# Altium footprint library SBCLib.PcbLib: 120 footprints (part 3 of 8) (continued)
## FCBGA (ABZ) [mm] (continued)
Top Overlay:
  lines w0.5: -12.2,11.2 -12.2,12.2 -11.2,12.2 ; -11.8,-11.8 -11.8,11.2 -11.8,11.8 8.4,11.8 11.8,11.8 11.8,11.6 11.8,-11.8 -10.6,-11.8 -11.8,-11.8
Mechanical 3:
  circle w0.076: c-10.8,10.8 r0.566
  lines w0.076: -11.5,0 11.5,0 ; 0,-11.5 0,11.5 ; -11.9,11.5 -11.9,11.5 ; -11.5,-11.5 -11.5,11.5 11.5,11.5 11.5,-11.5 -11.5,-11.5
  text "28" at 11,12.2 h0.4
  text "27" at 10.2,12.2 h0.4
  text "26" at 9.4,12.2 h0.4
  text "25" at 8.6,12.2 h0.4
  text "24" at 7.8,12.2 h0.4
  text "23" at 7,12.2 h0.4
  text "22" at 6.2,12.2 h0.4
  text "21" at 5.4,12.2 h0.4
  text "20" at 4.6,12.2 h0.4
  text "19" at 3.8,12.2 h0.4
  text "18" at 3,12.2 h0.4
  text "17" at 2.2,12.2 h0.4
  text "16" at 1.4,12.2 h0.4
  text "15" at 0.6,12.2 h0.4
  text "14" at -0.2,12.2 h0.4
  text "13" at -1,12.2 h0.4
  text "12" at -1.8,12.2 h0.4
  text "11" at -2.6,12.2 h0.4
  text "10" at -3.4,12.2 h0.4
  text "9" at -4.2,12.2 h0.4
  text "8" at -5,12.2 h0.4
  text "7" at -5.8,12.2 h0.4
  text "6" at -6.6,12.2 h0.4
  text "5" at -7.4,12.2 h0.4
  text "4" at -8.2,12.2 h0.4
  text "3" at -9,12.2 h0.4
  text "2" at -9.8,12.2 h0.4
  text "1" at -10.6,12.2 h0.4
  text "AH" at -12.8,-11 h0.4
  text "AG" at -12.8,-10.2 h0.4
  text "AF" at -12.8,-9.4 h0.4
  text "AE" at -12.8,-8.6 h0.4
  text "AD" at -12.8,-7.8 h0.4
  text "AC" at -12.8,-7 h0.4
  text "AB" at -12.8,-6.2 h0.4
  text "AA" at -12.8,-5.4 h0.4
  text "Y" at -12.8,-4.6 h0.4
  text "W" at -12.8,-3.8 h0.4
  text "V" at -12.8,-3 h0.4
  text "U" at -12.8,-2.2 h0.4
  text "T" at -12.8,-1.4 h0.4
  text "R" at -12.8,-0.6 h0.4
  text "P" at -12.8,0.2 h0.4
  text "N" at -12.8,1 h0.4
  text "M" at -12.8,1.8 h0.4
  text "L" at -12.8,2.6 h0.4
  text "K" at -12.8,3.4 h0.4
  text "J" at -12.8,4.2 h0.4
  text "H" at -12.8,5 h0.4
  text "G" at -12.8,5.8 h0.4
  text "F" at -12.8,6.6 h0.4
  text "E" at -12.8,7.4 h0.4
  text "D" at -12.8,8.2 h0.4
  text "C" at -12.8,9 h0.4
  text "B" at -12.8,9.8 h0.4
  text "A" at -12.8,10.6 h0.4
Mechanical 10:
  drawing of 181 lines, arcs and shapes, not listed
  text "Power Pins" at -10.8,13.2 h1
Mechanical 12:
  circle w0.3: c-0.4,-6.8 r0.15
  circle w0.3: c0.4,-9.2 r0.15
  circle w0.3: c-0.4,-2 r0.15
  circle w0.3: c-3.6,-7.6 r0.15
  circle w0.3: c-2.8,-6 r0.15
  circle w0.3: c-2.8,-5.2 r0.15
  circle w0.3: c-3.6,-8.4 r0.15
  circle w0.3: c-1.2,-8.4 r0.15
  circle w0.3: c-1.2,-7.6 r0.15
  circle w0.3: c3.6,-8.4 r0.15
  circle w0.3: c3.6,-7.6 r0.15
  circle w0.3: c10.8,-3.6 r0.15
  circle w0.3: c8.4,-3.6 r0.15
  circle w0.3: c7.6,-3.6 r0.15
  circle w0.3: c0.4,-3.6 r0.15
  circle w0.3: c-10.8,-3.6 r0.15
  circle w0.3: c2,-2.8 r0.15
  circle w0.3: c0.4,-2.8 r0.15
  circle w0.3: c5.2,-2 r0.15
  circle w0.3: c4.4,-2 r0.15
  circle w0.3: c2,-2 r0.15
  circle w0.3: c0.4,-2 r0.15
  circle w0.3: c5.2,-1.2 r0.15
  circle w0.3: c2.8,-1.2 r0.15
  circle w0.3: c2,-1.2 r0.15
  circle w0.3: c0.4,-1.2 r0.15
  circle w0.3: c-0.4,-1.2 r0.15
  circle w0.3: c-2,-1.2 r0.15
  circle w0.3: c-2.8,-1.2 r0.15
  circle w0.3: c-3.6,-1.2 r0.15
  circle w0.3: c5.2,-0.4 r0.15
  circle w0.3: c0.4,-0.4 r0.15
  circle w0.3: c-1.2,-0.4 r0.15
  circle w0.3: c-2,-0.4 r0.15
  circle w0.3: c-10.8,-0.4 r0.15
  circle w0.3: c10.8,0.4 r0.15
  circle w0.3: c8.4,1.2 r0.15
  circle w0.3: c7.6,1.2 r0.15
  circle w0.3: c3.6,1.2 r0.15
  circle w0.3: c0.4,1.2 r0.15
  circle w0.3: c-0.4,1.2 r0.15
  circle w0.3: c3.6,2 r0.15
  circle w0.3: c-0.4,2.8 r0.15
  circle w0.3: c-1.2,2.8 r0.15
  circle w0.3: c-7.6,3.6 r0.15
  circle w0.3: c-8.4,3.6 r0.15
  circle w0.3: c8.4,3.6 r0.15
  circle w0.3: c7.6,3.6 r0.15
  circle w0.3: c0.4,3.6 r0.15
  circle w0.3: c-10.8,3.6 r0.15
  circle w0.3: c10.8,4.4 r0.15
  circle w0.3: c0.4,4.4 r0.15
  circle w0.3: c-2,4.4 r0.15
  circle w0.3: c-2,5.2 r0.15
  circle w0.3: c-4.4,6 r0.15
  circle w0.3: c-5.2,6 r0.15
  circle w0.3: c-6,6 r0.15
  circle w0.3: c-6,6.8 r0.15
  circle w0.3: c-10.8,6.8 r0.15
  circle w0.3: c3.6,7.6 r0.15
  circle w0.3: c-1.2,7.6 r0.15
  circle w0.3: c3.6,8.4 r0.15
  circle w0.3: c-1.2,8.4 r0.15
  circle w0.3: c-10.8,10 r0.15
  circle w0.3: c-5.2,-10.8 r0.15
  circle w0.3: c10.8,-10.8 r0.15
  circle w0.3: c4.4,-10.8 r0.15
  circle w0.3: c-10,-10.8 r0.15
  circle w0.3: c-10.8,-10.8 r0.15
  circle w0.3: c-10.8,-10 r0.15
  circle w0.3: c7.6,-7.6 r0.15
  circle w0.3: c-10.8,-7.6 r0.15
  circle w0.3: c4.4,-6 r0.15
  circle w0.3: c-0.4,-6 r0.15
  circle w0.3: c-4.4,-5.2 r0.15
  circle w0.3: c-5.2,-5.2 r0.15
  circle w0.3: c4.4,-5.2 r0.15
  circle w0.3: c0.4,-5.2 r0.15
  circle w0.3: c-0.4,-5.2 r0.15
  circle w0.3: c-3.6,-5.2 r0.15
  circle w0.3: c-6.8,10.8 r0.15
  circle w0.3: c10.8,10.8 r0.15
  circle w0.3: c6.8,10.8 r0.15
  circle w0.3: c-0.4,10.8 r0.15
  circle w0.3: c-10,10.8 r0.15
  circle w0.3: c-10.8,10.8 r0.15
  text "GND Pins" at -10.8,13.2 h1
Mechanical 13:
  circle w0.3: c-4.4,4.4 r0.15
  circle w0.3: c-3.6,4.4 r0.15
  circle w0.3: c1.2,4.4 r0.15
  circle w0.3: c3.6,4.4 r0.15
  circle w0.3: c-4.4,3.6 r0.15
  circle w0.3: c1.2,3.6 r0.15
  circle w0.3: c3.6,3.6 r0.15
  circle w0.3: c-4.4,2.8 r0.15
  circle w0.3: c3.6,0.4 r0.15
  circle w0.3: c4.4,-0.4 r0.15
  circle w0.3: c4.4,-1.2 r0.15
  circle w0.3: c-1.2,-4.4 r0.15
  circle w0.3: c-0.4,-4.4 r0.15
  circle w0.3: c0.4,-4.4 r0.15
  circle w0.3: c1.2,-4.4 r0.15
  text "CAP Pins" at -10.8,13.2 h1
Mechanical 14:
  circle w0.1: c-9.2,2 r0.25
  circle w0.1: c-7.6,2 r0.25
  circle w0.1: c-10.8,-1.2 r0.25
  circle w0.1: c-10.8,6 r0.25
  circle w0.1: c-8.4,-9.2 r0.25
  circle w0.1: c-7.6,6.8 r0.25
  circle w0.1: c-9.2,-9.2 r0.25
  circle w0.1: c-6.8,7.6 r0.25
  circle w0.1: c-6.8,-9.2 r0.25
  circle w0.1: c-9.2,8.4 r0.25
  circle w0.1: c-10,-9.2 r0.25
  circle w0.1: c-6.8,6.8 r0.25
  circle w0.1: c-7.6,-10 r0.25
  circle w0.1: c-6.8,5.2 r0.25
  circle w0.1: c-6.8,1.2 r0.25
  circle w0.1: c-7.6,5.2 r0.25
  circle w0.1: c-6,0.4 r0.25
  circle w0.1: c-8.4,5.2 r0.25
  circle w0.1: c-6.8,4.4 r0.25
  circle w0.1: c-6,5.2 r0.25
  circle w0.1: c-8.4,4.4 r0.25
  circle w0.1: c-10,-0.4 r0.25
  circle w0.1: c-10.8,7.6 r0.25
  circle w0.1: c-6,4.4 r0.25
  circle w0.1: c-9.2,0.4 r0.25
  circle w0.1: c-6.8,3.6 r0.25
  circle w0.1: c-10.8,-2 r0.25
  circle w0.1: c-10,1.2 r0.25
  circle w0.1: c-7.6,4.4 r0.25
  circle w0.1: c-10,-2 r0.25
  circle w0.1: c-6,2 r0.25
  circle w0.1: c-10,-1.2 r0.25
  circle w0.1: c-10,0.4 r0.25
  circle w0.1: c-6,3.6 r0.25
  circle w0.1: c-9.2,-0.4 r0.25
  circle w0.3: c-4.4,0.4 r0.15
  circle w0.3: c-4.4,1.2 r0.15
  circle w0.3: c-8.4,-0.4 r0.15
  circle w0.3: c-6,1.2 r0.15
  circle w0.3: c-7.6,0.4 r0.15
  circle w0.3: c-7.6,-0.4 r0.15
  circle w0.3: c-4.4,-0.4 r0.15
  circle w0.3: c-6.8,0.4 r0.15
  circle w0.1: c-8.4,2 r0.25
  circle w0.1: c-6,-1.2 r0.25
  circle w0.1: c-10.8,1.2 r0.25
  circle w0.1: c-6.8,-1.2 r0.25
  circle w0.1: c-10.8,0.4 r0.25
  circle w0.1: c-4.4,-1.2 r0.25
  circle w0.1: c-8.4,0.4 r0.25
  circle w0.1: c-6.8,-0.4 r0.25
  circle w0.3: c-9.2,5.2 r0.15
  circle w0.3: c-10,5.2 r0.15
  circle w0.3: c-9.2,4.4 r0.15
  circle w0.3: c-10.8,5.2 r0.15
  circle w0.3: c-10,4.4 r0.15
  circle w0.3: c-10.8,4.4 r0.15
  circle w0.3: c-10,3.6 r0.15
  circle w0.3: c-10.8,2.8 r0.15
  circle w0.3: c-10,2.8 r0.15
  circle w0.3: c-9.2,2.8 r0.15
  circle w0.3: c-8.4,2.8 r0.15
  circle w0.3: c-6.8,2.8 r0.15
  circle w0.3: c-10.8,2 r0.15
  circle w0.3: c-7.6,2.8 r0.15
  circle w0.3: c-10,2 r0.15
  circle w0.3: c-6.8,2 r0.15
  text "GPMC Pins" at -10.8,13.2 h1
Mechanical 15:
  circle w0.3: c2.8,-4.4 r0.15
  circle w0.3: c10.8,-2.8 r0.15
  circle w0.3: c10,-4.4 r0.15
  circle w0.3: c10.8,-4.4 r0.15
  circle w0.3: c10.8,-7.6 r0.15
  circle w0.3: c10,-7.6 r0.15
  circle w0.3: c10,-8.4 r0.15
  circle w0.3: c8.4,-10 r0.15
  circle w0.3: c8.4,-10.8 r0.15
  circle w0.3: c9.2,-2.8 r0.15
  circle w0.3: c10,-5.2 r0.15
  circle w0.3: c9.2,-6.8 r0.15
  circle w0.3: c6.8,-6 r0.15
  circle w0.3: c6.8,-7.6 r0.15
  circle w0.3: c9.2,-4.4 r0.15
  circle w0.3: c8.4,-2.8 r0.15
  circle w0.3: c7.6,-2.8 r0.15
  circle w0.3: c8.4,-4.4 r0.15
  circle w0.3: c6.8,-3.6 r0.15
  circle w0.3: c3.6,-3.6 r0.15
  circle w0.3: c6.8,-2.8 r0.15
  circle w0.3: c6,-3.6 r0.15
  circle w0.3: c10.8,-5.2 r0.15
  circle w0.3: c8.4,-5.2 r0.15
  circle w0.3: c9.2,-5.2 r0.15
  circle w0.3: c7.6,-4.4 r0.15
  circle w0.3: c7.6,-5.2 r0.15
  circle w0.3: c6.8,-4.4 r0.15
  circle w0.3: c6,-4.4 r0.15
  circle w0.3: c6.8,-5.2 r0.15
  circle w0.3: c4.4,-4.4 r0.15
  circle w0.3: c10,-6 r0.15
  circle w0.3: c3.6,-4.4 r0.15
  circle w0.3: c10,-6.8 r0.15
  circle w0.3: c10.8,-6.8 r0.15
  circle w0.3: c10.8,-6 r0.15
  circle w0.3: c4.4,-3.6 r0.15
  circle w0.3: c4.4,-2.8 r0.15
  circle w0.3: c8.4,-7.6 r0.15
  circle w0.3: c7.6,-6.8 r0.15
  circle w0.3: c8.4,-6.8 r0.15
  circle w0.3: c9.2,-8.4 r0.15
  circle w0.3: c10.8,-8.4 r0.15
  circle w0.3: c10.8,-9.2 r0.15
  circle w0.3: c10,-10 r0.15
  circle w0.3: c10,-9.2 r0.15
  circle w0.3: c6.8,-6.8 r0.15
  circle w0.3: c6.8,-8.4 r0.15
  circle w0.3: c6.8,-9.2 r0.15
  circle w0.3: c7.6,-8.4 r0.15
  circle w0.3: c7.6,-9.2 r0.15
  circle w0.3: c9.2,-10.8 r0.15
  circle w0.3: c9.2,-10 r0.15
  circle w0.3: c9.2,-9.2 r0.15
  circle w0.3: c8.4,-9.2 r0.15
  circle w0.3: c2.8,-7.6 r0.15
  circle w0.3: c2,-8.4 r0.15
  circle w0.3: c2.8,-9.2 r0.15
  circle w0.3: c5.2,-6.8 r0.15
  circle w0.3: c6,-7.6 r0.15
  circle w0.3: c5.2,-7.6 r0.15
  circle w0.3: c6,-8.4 r0.15
  circle w0.3: c6,-9.2 r0.15
  circle w0.3: c5.2,-8.4 r0.15
  circle w0.3: c6.8,-10 r0.15
  circle w0.3: c6,-10.8 r0.15
  circle w0.3: c5.2,-9.2 r0.15
  circle w0.3: c3.6,-6 r0.15
  circle w0.3: c4.4,-6.8 r0.15
  circle w0.3: c3.6,-6.8 r0.15
  circle w0.3: c4.4,-7.6 r0.15
  circle w0.3: c2.8,-6 r0.15
  circle w0.3: c2.8,-8.4 r0.15
  circle w0.3: c2,-9.2 r0.15
  circle w0.3: c5.2,-10 r0.15
  circle w0.3: c5.2,-10.8 r0.15
  circle w0.3: c4.4,-9.2 r0.15
  circle w0.3: c2.8,-6.8 r0.15
  circle w0.3: c4.4,-8.4 r0.15
  circle w0.3: c7.6,-10.8 r0.15
  circle w0.3: c7.6,-10 r0.15
  circle w0.3: c6,-10 r0.15
  circle w0.3: c6.8,-10.8 r0.15
  text "EMIF CH1 Pins (DDR RAM)" at -10.8,13.2 h1
Mechanical 16:
  circle w0.3: c6,1.2 r0.15
  circle w0.3: c10,2 r0.15
  circle w0.3: c10.8,2 r0.15
  circle w0.3: c10.8,3.6 r0.15
  circle w0.3: c10,3.6 r0.15
  circle w0.3: c10.8,5.2 r0.15
  circle w0.3: c10,5.2 r0.15
  circle w0.3: c10,6 r0.15
  circle w0.3: c10.8,6 r0.15
  circle w0.3: c6,2 r0.15
  circle w0.3: c6.8,3.6 r0.15
  circle w0.3: c7.6,6 r0.15
  circle w0.3: c10.8,6.8 r0.15
  circle w0.3: c9.2,2 r0.15
  circle w0.3: c8.4,2 r0.15
  circle w0.3: c7.6,2 r0.15
  circle w0.3: c6.8,2 r0.15
  circle w0.3: c10.8,2.8 r0.15
  circle w0.3: c8.4,2.8 r0.15
  circle w0.3: c9.2,2.8 r0.15
  circle w0.3: c10,2.8 r0.15
  circle w0.3: c4.4,4.4 r0.15
  circle w0.3: c6,3.6 r0.15
  circle w0.3: c6.8,4.4 r0.15
  circle w0.3: c7.6,2.8 r0.15
  circle w0.3: c6.8,2.8 r0.15
  circle w0.3: c5.2,3.6 r0.15
  circle w0.3: c4.4,3.6 r0.15
  circle w0.3: c6,2.8 r0.15
  circle w0.3: c7.6,4.4 r0.15
  circle w0.3: c9.2,4.4 r0.15
  circle w0.3: c8.4,4.4 r0.15
  circle w0.3: c9.2,6 r0.15
  circle w0.3: c9.2,5.2 r0.15
  circle w0.3: c7.6,5.2 r0.15
  circle w0.3: c8.4,5.2 r0.15
  circle w0.3: c6.8,5.2 r0.15
  circle w0.3: c10.8,7.6 r0.15
  circle w0.3: c10,7.6 r0.15
  circle w0.3: c10,6.8 r0.15
  circle w0.3: c9.2,6.8 r0.15
  circle w0.3: c7.6,6.8 r0.15
  circle w0.3: c8.4,6.8 r0.15
  circle w0.3: c8.4,6 r0.15
  circle w0.3: c9.2,7.6 r0.15
  circle w0.3: c6,-2 r0.15
  circle w0.3: c6,-0.4 r0.15
  circle w0.3: c6,-1.2 r0.15
  circle w0.3: c10.8,1.2 r0.15
  circle w0.3: c9.2,0.4 r0.15
  circle w0.3: c6.8,1.2 r0.15
  circle w0.3: c10,1.2 r0.15
  circle w0.3: c4.4,1.2 r0.15
  circle w0.3: c8.4,0.4 r0.15
  circle w0.3: c6,0.4 r0.15
  circle w0.3: c6.8,0.4 r0.15
  circle w0.3: c10,0.4 r0.15
  circle w0.3: c10,-0.4 r0.15
  circle w0.3: c10.8,-0.4 r0.15
  circle w0.3: c9.2,-0.4 r0.15
  circle w0.3: c8.4,-0.4 r0.15
  circle w0.3: c9.2,-2 r0.15
  circle w0.3: c10,-2 r0.15
  circle w0.3: c6.8,-2 r0.15
  circle w0.3: c7.6,-0.4 r0.15
  circle w0.3: c8.4,-2 r0.15
  circle w0.3: c6.8,-1.2 r0.15
  circle w0.3: c10.8,-2 r0.15
  circle w0.3: c6.8,-0.4 r0.15
  circle w0.3: c10,-1.2 r0.15
  circle w0.3: c10.8,-1.2 r0.15
  circle w0.3: c7.6,-2 r0.15
  circle w0.3: c7.6,0.4 r0.15
  text "EMIF CH2 Pins (DDR RAM)" at -10.8,13.2 h1
Mechanical 17:
  circle w0.3: c2.8,-10.8 r0.15
  circle w0.3: c2,-10.8 r0.15
  circle w0.3: c2,-10 r0.15
  circle w0.3: c2.8,-10 r0.15
  circle w0.3: c3.6,-10.8 r0.15
  circle w0.3: c3.6,-10 r0.15
  circle w0.3: c1.2,-10.8 r0.15
  circle w0.3: c1.2,-10 r0.15
  circle w0.3: c2,6.8 r0.15
  circle w0.3: c8.4,9.2 r0.15
  circle w0.1: c5.2,10 r0.25
  circle w0.1: c4.4,6 r0.25
  circle w0.1: c3.6,6 r0.25
  circle w0.1: c4.4,10 r0.25
  text "HDMI Pins" at -10.8,13.2 h1
Mechanical 18:
  circle w0.3: c-3.6,10.8 r0.15
  circle w0.3: c-4.4,10 r0.15
  circle w0.3: c-4.4,10.8 r0.15
  circle w0.3: c-4.4,9.2 r0.15
  circle w0.3: c-5.2,10.8 r0.15
  circle w0.3: c-6,10.8 r0.15
  circle w0.3: c-5.2,10 r0.15
  circle w0.3: c-6,10 r0.15
  circle w0.3: c-6,9.2 r0.15
  circle w0.3: c-5.2,9.2 r0.15
  circle w0.3: c-6.8,9.2 r0.15
  circle w0.3: c-7.6,10.8 r0.15
  circle w0.3: c-5.2,8.4 r0.15
  circle w0.3: c-6,8.4 r0.15
  circle w0.3: c-4.4,8.4 r0.15
  circle w0.3: c-5.2,7.6 r0.15
  circle w0.3: c-6,7.6 r0.15
  circle w0.3: c-5.2,6.8 r0.15
  circle w0.3: c-4.4,6.8 r0.15
  circle w0.3: c-4.4,7.6 r0.15
  circle w0.3: c-2.8,6 r0.15
  circle w0.3: c-3.6,6.8 r0.15
  circle w0.3: c-3.6,6 r0.15
  circle w0.3: c-2.8,6.8 r0.15
  circle w0.3: c-2.8,7.6 r0.15
  circle w0.3: c-2.8,9.2 r0.15
  circle w0.3: c-2.8,10 r0.15
  circle w0.3: c-3.6,10 r0.15
  circle w0.3: c-2.8,8.4 r0.15
  text "DPI Video Out 1 Pins" at -10.8,13.2 h1
Mechanical 19:
  circle w0.1: c-10,6.8 r0.25
  circle w0.1: c-8.4,-5.2 r0.25
  circle w0.1: c-9.2,-6 r0.25
  circle w0.1: c-9.2,6.8 r0.25
  circle w0.1: c-10.8,8.4 r0.25
  circle w0.1: c-4.4,-6 r0.25
  circle w0.1: c-9.2,-5.2 r0.25
  circle w0.1: c-10,7.6 r0.25
  circle w0.1: c2,8.4 r0.25
  circle w0.1: c-10,8.4 r0.25
  circle w0.1: c1.2,6 r0.25
  circle w0.1: c-8.4,6.8 r0.25
  circle w0.1: c5.2,10.8 r0.25
  circle w0.1: c-10.8,9.2 r0.25
  circle w0.1: c2.8,9.2 r0.25
  circle w0.1: c-8.4,7.6 r0.25
  circle w0.1: c-7.6,6.8 r0.25
  circle w0.1: c2,10.8 r0.25
  circle w0.1: c2,10 r0.25
  circle w0.1: c-6.8,7.6 r0.25
  circle w0.1: c-9.2,8.4 r0.25
  circle w0.1: c1.2,10 r0.25
  circle w0.1: c0.4,8.4 r0.25
  circle w0.1: c-6.8,6.8 r0.25
  circle w0.1: c0.4,10.8 r0.25
  circle w0.1: c-7.6,8.4 r0.25
  circle w0.1: c-10,9.2 r0.25
  circle w0.1: c0.4,10 r0.25
  circle w0.1: c4.4,10.8 r0.25
  circle w0.1: c-9.2,9.2 r0.25
  circle w0.1: c0.4,7.6 r0.25
  circle w0.1: c-8.4,9.2 r0.25
  circle w0.1: c-2,8.4 r0.25
  circle w0.1: c-10,10 r0.25
  circle w0.1: c-2,9.2 r0.25
  circle w0.1: c-6.8,8.4 r0.25
  circle w0.1: c-7.6,9.2 r0.25
  circle w0.1: c-1.2,6.8 r0.25
  circle w0.1: c-2,7.6 r0.25
  circle w0.1: c-9.2,10.8 r0.25
  circle w0.1: c-2.8,4.4 r0.25
  circle w0.1: c-9.2,10 r0.25
  circle w0.1: c-8.4,10 r0.25
  circle w0.1: c-1.2,6 r0.25
  circle w0.1: c-0.4,4.4 r0.25
  circle w0.1: c-7.6,10 r0.25
  circle w0.1: c-8.4,10.8 r0.25
  circle w0.1: c-0.4,10 r0.25
  circle w0.1: c4.4,6.8 r0.25
  circle w0.1: c-6.8,6 r0.25
  circle w0.1: c-10.8,6 r0.25
  circle w0.1: c5.2,7.6 r0.25
  circle w0.1: c5.2,6.8 r0.25
  circle w0.1: c-10.8,7.6 r0.25
  circle w0.1: c-10,6 r0.25
  circle w0.1: c6.8,9.2 r0.25
  circle w0.1: c9.2,10 r0.25
  circle w0.1: c-6,5.2 r0.25
  text "DPI Video Out 2 Pins" at -10.8,13.2 h1
Mechanical 20:
  circle w0.1: c-7.6,0.4 r0.25
  circle w0.1: c-5.2,-8.4 r0.25
  circle w0.1: c-5.2,-7.6 r0.25
  circle w0.1: c-7.6,-0.4 r0.25
  circle w0.1: c-6,-10 r0.25
  circle w0.1: c-4.4,-0.4 r0.25
  circle w0.1: c-6.8,-10.8 r0.25
  circle w0.1: c-6.8,0.4 r0.25
  circle w0.1: c-6,-1.2 r0.25
  circle w0.1: c-9.2,-10.8 r0.25
  circle w0.1: c-7.6,-10.8 r0.25
  circle w0.1: c-6.8,-1.2 r0.25
  circle w0.1: c-6.8,-10 r0.25
  circle w0.1: c-4.4,-7.6 r0.25
  circle w0.1: c-4.4,-1.2 r0.25
  circle w0.1: c-8.4,-10.8 r0.25
  circle w0.1: c-5.2,-10 r0.25
  circle w0.1: c-6.8,-0.4 r0.25
  circle w0.1: c-8.4,-10 r0.25
  circle w0.1: c-9.2,5.2 r0.25
  circle w0.1: c-10,5.2 r0.25
  circle w0.1: c-10,-10 r0.25
  circle w0.1: c-9.2,-10 r0.25
  circle w0.1: c-9.2,4.4 r0.25
  circle w0.1: c-10.8,5.2 r0.25
  circle w0.1: c-7.6,-10 r0.25
  circle w0.1: c-10,-9.2 r0.25
  circle w0.1: c-10,4.4 r0.25
  circle w0.1: c-10.8,4.4 r0.25
  circle w0.1: c-6.8,-9.2 r0.25
  circle w0.1: c-9.2,-9.2 r0.25
  circle w0.1: c-10,3.6 r0.25
  circle w0.1: c-10.8,2.8 r0.25
  circle w0.1: c-8.4,-9.2 r0.25
  circle w0.1: c-10.8,-9.2 r0.25
  circle w0.1: c-5.2,-8.4 r0.25
  circle w0.1: c-10,2.8 r0.25
  circle w0.1: c-9.2,2.8 r0.25
  circle w0.1: c-5.2,-7.6 r0.25
  circle w0.1: c-9.2,-8.4 r0.25
  circle w0.1: c-7.6,-8.4 r0.25
  circle w0.1: c-6,-10 r0.25
  circle w0.1: c-8.4,2.8 r0.25
  circle w0.1: c-10.8,-8.4 r0.25
  circle w0.1: c-6.8,-10.8 r0.25
  circle w0.1: c-6.8,2.8 r0.25
  circle w0.1: c-10.8,2 r0.25
  circle w0.1: c-9.2,-10.8 r0.25
  circle w0.1: c-10,-8.4 r0.25
  circle w0.1: c-6.8,-8.4 r0.25
  circle w0.1: c-7.6,-10.8 r0.25
  circle w0.1: c-7.6,2.8 r0.25
  circle w0.1: c-10,2 r0.25
  circle w0.1: c-6.8,-10 r0.25
  circle w0.1: c-10,-7.6 r0.25
  circle w0.1: c-9.2,-7.6 r0.25
  circle w0.1: c-8.4,-10.8 r0.25
  circle w0.1: c-6.8,2 r0.25
  circle w0.1: c-5.2,-9.2 r0.25
  circle w0.1: c-8.4,-0.4 r0.25
  circle w0.1: c-6,1.2 r0.25
  circle w0.1: c-4.4,-8.4 r0.25
  circle w0.1: c-5.2,-10 r0.25
  circle w0.1: c-4.4,0.4 r0.25
  circle w0.1: c-4.4,-7.6 r0.25
  circle w0.1: c-4.4,1.2 r0.25
  circle w0.1: c-4.4,-9.2 r0.25
  circle w0.1: c-10.8,0.4 r0.25
  text "DPI Video Out 3 Pins" at -10.8,13.2 h1
Mechanical 21:
  circle w0.3: c-2,-7.6 r0.15
  circle w0.3: c-2,-6.8 r0.15
  circle w0.3: c-3.6,-6 r0.15
  circle w0.3: c-2,-9.2 r0.15
  circle w0.3: c-2,-8.4 r0.15
  circle w0.3: c-2.8,-6.8 r0.15
  circle w0.3: c-2.8,-7.6 r0.15
  circle w0.3: c-2.8,-8.4 r0.15
  circle w0.3: c-2.8,-9.2 r0.15
  circle w0.3: c-3.6,-6.8 r0.15
  text "USB Pins" at -10.8,13.2 h1
Mechanical 22:
  circle w0.3: c-4.4,-10.8 r0.15
  circle w0.3: c-4.4,-10 r0.15
  circle w0.3: c-3.6,-10 r0.15
  circle w0.3: c-3.6,-10.8 r0.15
  circle w0.1: c6,10.8 r0.25
  circle w0.1: c3.6,6 r0.25
  text "SATA Pins" at -10.8,13.2 h1
Mechanical 23:
  circle w0.3: c-1.2,-10 r0.15
  circle w0.3: c-1.2,-10.8 r0.15
  circle w0.3: c-0.4,-10 r0.15
  circle w0.3: c-0.4,-10.8 r0.15
  circle w0.3: c-2.8,-10 r0.15
  circle w0.3: c-2.8,-10.8 r0.15
  circle w0.3: c-2,-10 r0.15
  circle w0.3: c-2,-10.8 r0.15
  circle w0.3: c0.4,-10 r0.15
  circle w0.3: c0.4,-10.8 r0.15
  text "PCIe Pins" at -10.8,13.2 h1
Mechanical 24:
  circle w0.3: c4.4,6 r0.15
  circle w0.1: c3.6,6 r0.25
  circle w0.1: c2,-7.6 r0.25
  circle w0.1: c5.2,7.6 r0.25
  circle w0.1: c5.2,10 r0.25
  circle w0.1: c4.4,6.8 r0.25
  circle w0.1: c4.4,10 r0.25
  circle w0.1: c2,-6.8 r0.25
  circle w0.1: c5.2,7.6 r0.25
  circle w0.1: c4.4,6 r0.25
  circle w0.1: c4.4,6.8 r0.25
  circle w0.1: c3.6,6 r0.25
  text "CAN (DCAN and MCAN) Pins" at -10.8,13.2 h1
Mechanical 25:
  circle w0.3: c-4.4,-3.6 r0.15
  circle w0.3: c-4.4,-2.8 r0.15
  circle w0.3: c-6,-2.8 r0.15
  circle w0.3: c-6,-2 r0.15
  circle w0.3: c-6.8,-2.8 r0.15
  circle w0.3: c-6.8,-2 r0.15
  circle w0.3: c-7.6,-2 r0.15
  circle w0.3: c-7.6,-2.8 r0.15
  circle w0.3: c-8.4,-2.8 r0.15
  circle w0.3: c-9.2,-2.8 r0.15
  circle w0.3: c-10,-4.4 r0.15
  circle w0.3: c-10,-3.6 r0.15
  circle w0.3: c-7.6,8.4 r0.15
  circle w0.3: c-10,9.2 r0.15
  circle w0.3: c-9.2,9.2 r0.15
  circle w0.3: c-8.4,9.2 r0.15
  circle w0.3: c-7.6,9.2 r0.15
  circle w0.3: c-9.2,10.8 r0.15
  circle w0.3: c-9.2,10 r0.15
  circle w0.3: c-8.4,10 r0.15
  circle w0.3: c-7.6,10 r0.15
  circle w0.3: c-8.4,10.8 r0.15
  circle w0.3: c-10.8,9.2 r0.15
  circle w0.3: c-8.4,7.6 r0.15
  circle w0.3: c-7.6,6.8 r0.15
  circle w0.3: c-6.8,7.6 r0.15
  circle w0.3: c-10,10 r0.15
  circle w0.3: c-6.8,8.4 r0.15
  circle w0.3: c-10.8,-4.4 r0.15
  circle w0.3: c-10,-2.8 r0.15
  circle w0.3: c-8.4,-2 r0.15
  circle w0.3: c-10.8,-2.8 r0.15
  circle w0.1: c-6.8,6.8 r0.25
  circle w0.1: c-9.2,8.4 r0.25
  circle w0.1: c4.4,10 r0.25
  circle w0.1: c5.2,10 r0.25
  circle w0.1: c-8.4,-6 r0.25
  circle w0.1: c-7.6,-6.8 r0.25
  text "GMAC_SW (Ethernet MAC) Pins" at -10.8,13.2 h1
Mechanical 26:
  circle w0.3: c-6.8,-3.6 r0.15
  circle w0.3: c-6.8,-4.4 r0.15
  circle w0.3: c-6,-3.6 r0.15
  circle w0.3: c-4.4,-4.4 r0.15
  circle w0.3: c-6.8,-5.2 r0.15
  circle w0.3: c-8.4,-4.4 r0.15
  circle w0.3: c-7.6,-5.2 r0.15
  circle w0.3: c-9.2,-4.4 r0.15
  circle w0.3: c-6,4.4 r0.15
  circle w0.3: c-6.8,5.2 r0.15
  circle w0.3: c4.4,6 r0.15
  circle w0.3: c3.6,6 r0.15
  circle w0.3: c-8.4,4.4 r0.15
  circle w0.3: c-6.8,4.4 r0.15
  circle w0.3: c-8.4,5.2 r0.15
  circle w0.3: c-7.6,5.2 r0.15
  circle w0.3: c-6,3.6 r0.15
  circle w0.3: c-6,2 r0.15
  circle w0.3: c-7.6,4.4 r0.15
  circle w0.3: c-6.8,3.6 r0.15
  circle w0.3: c-8.4,-7.6 r0.15
  circle w0.3: c-8.4,-6.8 r0.15
  circle w0.3: c5.2,10 r0.15
  circle w0.3: c4.4,10 r0.15
  circle w0.3: c-6,-6.8 r0.15
  circle w0.3: c-6.8,-6.8 r0.15
  circle w0.3: c-4.4,-6.8 r0.15
  circle w0.3: c-9.2,-6.8 r0.15
  circle w0.3: c-5.2,-6.8 r0.15
  circle w0.3: c-6.8,-7.6 r0.15
  circle w0.3: c-5.2,-6 r0.15
  circle w0.3: c-7.6,-6 r0.15
  circle w0.3: c8.4,7.6 r0.15
  circle w0.3: c10,9.2 r0.15
  circle w0.3: c10,10 r0.15
  circle w0.3: c9.2,9.2 r0.15
  circle w0.3: c10.8,8.4 r0.15
  circle w0.3: c9.2,8.4 r0.15
  circle w0.3: c10,8.4 r0.15
  circle w0.3: c10.8,9.2 r0.15
  text "eMMC/SD/SDIO Pins" at -10.8,13.2 h1
Mechanical 27:
  circle w0.3: c-6.8,2 r0.15
  circle w0.3: c-10,2 r0.15
  circle w0.3: c-7.6,2.8 r0.15
  circle w0.3: c-10.8,2 r0.15
  circle w0.3: c-6.8,2.8 r0.15
  circle w0.3: c-8.4,2.8 r0.15
  circle w0.3: c-9.2,2.8 r0.15
  circle w0.3: c-10,2.8 r0.15
  circle w0.3: c-10.8,2.8 r0.15
  circle w0.3: c-10,3.6 r0.15
  circle w0.3: c-10.8,4.4 r0.15
  circle w0.3: c-10,4.4 r0.15
  circle w0.3: c-10.8,5.2 r0.15
  circle w0.3: c-9.2,4.4 r0.15
  circle w0.3: c-10,5.2 r0.15
  circle w0.3: c-9.2,5.2 r0.15
  text "Sysboot Pins" at -10.8,13.2 h1
Mechanical 28:
  circle w0.1: c5.2,6.8 r0.25
  circle w0.1: c-6,0.4 r0.25
  circle w0.1: c2.8,8.4 r0.25
  circle w0.1: c-10.8,1.2 r0.25
  circle w0.3: c6.8,9.2 r0.15
  circle w0.3: c6.8,6.8 r0.15
  circle w0.3: c6.8,7.6 r0.15
  circle w0.3: c6,6.8 r0.15
  circle w0.3: c2.8,8.4 r0.15
  circle w0.3: c2,7.6 r0.15
  circle w0.3: c9.2,10 r0.15
  circle w0.3: c0.4,-8.4 r0.15
  circle w0.3: c0.4,-7.6 r0.15
  circle w0.3: c0.4,-6.8 r0.15
  circle w0.3: c-1.2,-6.8 r0.15
  circle w0.3: c-9.2,-2 r0.15
  text "PRCM Pins" at -10.8,13.2 h1
Mechanical 29:
  circle w0.3: c2,-7.6 r0.15
  circle w0.3: c2,-6.8 r0.15
  circle w0.3: c1.2,-6 r0.15
  circle w0.3: c1.2,-6.8 r0.15
  circle w0.3: c2,-6 r0.15
  circle w0.3: c-0.4,-8.4 r0.15
  circle w0.3: c-0.4,-7.6 r0.15
  circle w0.3: c-0.4,-9.2 r0.15
  circle w0.3: c-2.8,-4.4 r0.15
  text "RTCSS Pins" at -10.8,13.2 h1
Mechanical 30:
  circle w0.3: c2.8,6.8 r0.15
  circle w0.3: c6.8,8.4 r0.15
  circle w0.3: c3.6,6.8 r0.15
  circle w0.3: c4.4,7.6 r0.15
  circle w0.3: c4.4,8.4 r0.15
  circle w0.3: c2.8,7.6 r0.15
  circle w0.3: c5.2,6 r0.15
  circle w0.3: c7.6,8.4 r0.15
  circle w0.3: c-3.6,6.8 r0.15
  circle w0.3: c-6,8.4 r0.15
  circle w0.3: c-6,10.8 r0.15
  circle w0.1: c-10.8,7.6 r0.25
  circle w0.1: c-10,6 r0.25
  circle w0.1: c-6,5.2 r0.25
  circle w0.1: c-10.8,6 r0.25
  circle w0.1: c-6.8,6 r0.25
  circle w0.1: c-10,6.8 r0.25
  circle w0.1: c-9.2,6.8 r0.25
  circle w0.1: c-10.8,8.4 r0.25
  circle w0.1: c-10,7.6 r0.25
  circle w0.1: c-10,8.4 r0.25
  circle w0.1: c-8.4,6.8 r0.25
  circle w0.1: c-10.8,9.2 r0.25
  circle w0.1: c-8.4,7.6 r0.25
  circle w0.1: c-7.6,6.8 r0.25
  circle w0.1: c-6.8,7.6 r0.25
  circle w0.1: c-2.8,6 r0.25
  circle w0.1: c-4.4,7.6 r0.25
  circle w0.1: c-4.4,6.8 r0.25
  circle w0.1: c-5.2,6.8 r0.25
  circle w0.1: c-6,7.6 r0.25
  circle w0.1: c-5.2,8.4 r0.25
  circle w0.1: c-7.6,10.8 r0.25
  circle w0.1: c-6.8,9.2 r0.25
  circle w0.1: c-5.2,9.2 r0.25
  circle w0.1: c-6,9.2 r0.25
  circle w0.1: c-5.2,10.8 r0.25
  circle w0.1: c-4.4,9.2 r0.25
  circle w0.1: c-4.4,10.8 r0.25
  circle w0.1: c-4.4,10 r0.25
  circle w0.1: c-3.6,10.8 r0.25
  text "Test Interface Pins" at -10.8,13.2 h1
3D body "ABZ0760A.stp": height 1.41, standoff 0, extent -11.5,-11.5 11.5,11.5

## FUSE SMT 1206 [mil]
pads (2):
  rect 46x62 smd paste+0: 1(-53.5,0) 2(53.5,0)
Top Overlay:
  circle w6: c-67.91,43.31 r3
  lines w6: -18.85,-36 18.85,-36 ; -18.85,36 18.85,36
Mechanical 3:
  lines w3: -53.5,-30.98 62.52,-30.98 62.52,31 -53.5,31 -53.5,-30.98
3D body "0458Series_LTF.step": height 62.01, standoff 0, extent -62.52,-30.98 62.52,30.99